# Altium footprint library LUMI_Standard_Auto_Soldering_LIB.PcbLib: 344 footprints (part 16 of 22)
Each footprint in its own frame and in the unit in brackets; x right, y up, seen from the top. Pads: shape width x height; smd on the part's side, far side on the other; paste and mask are expansions set on the pad; w line width, h text height; cw(c..) or ccw(c..) is an arc to the next point about the centre after c.
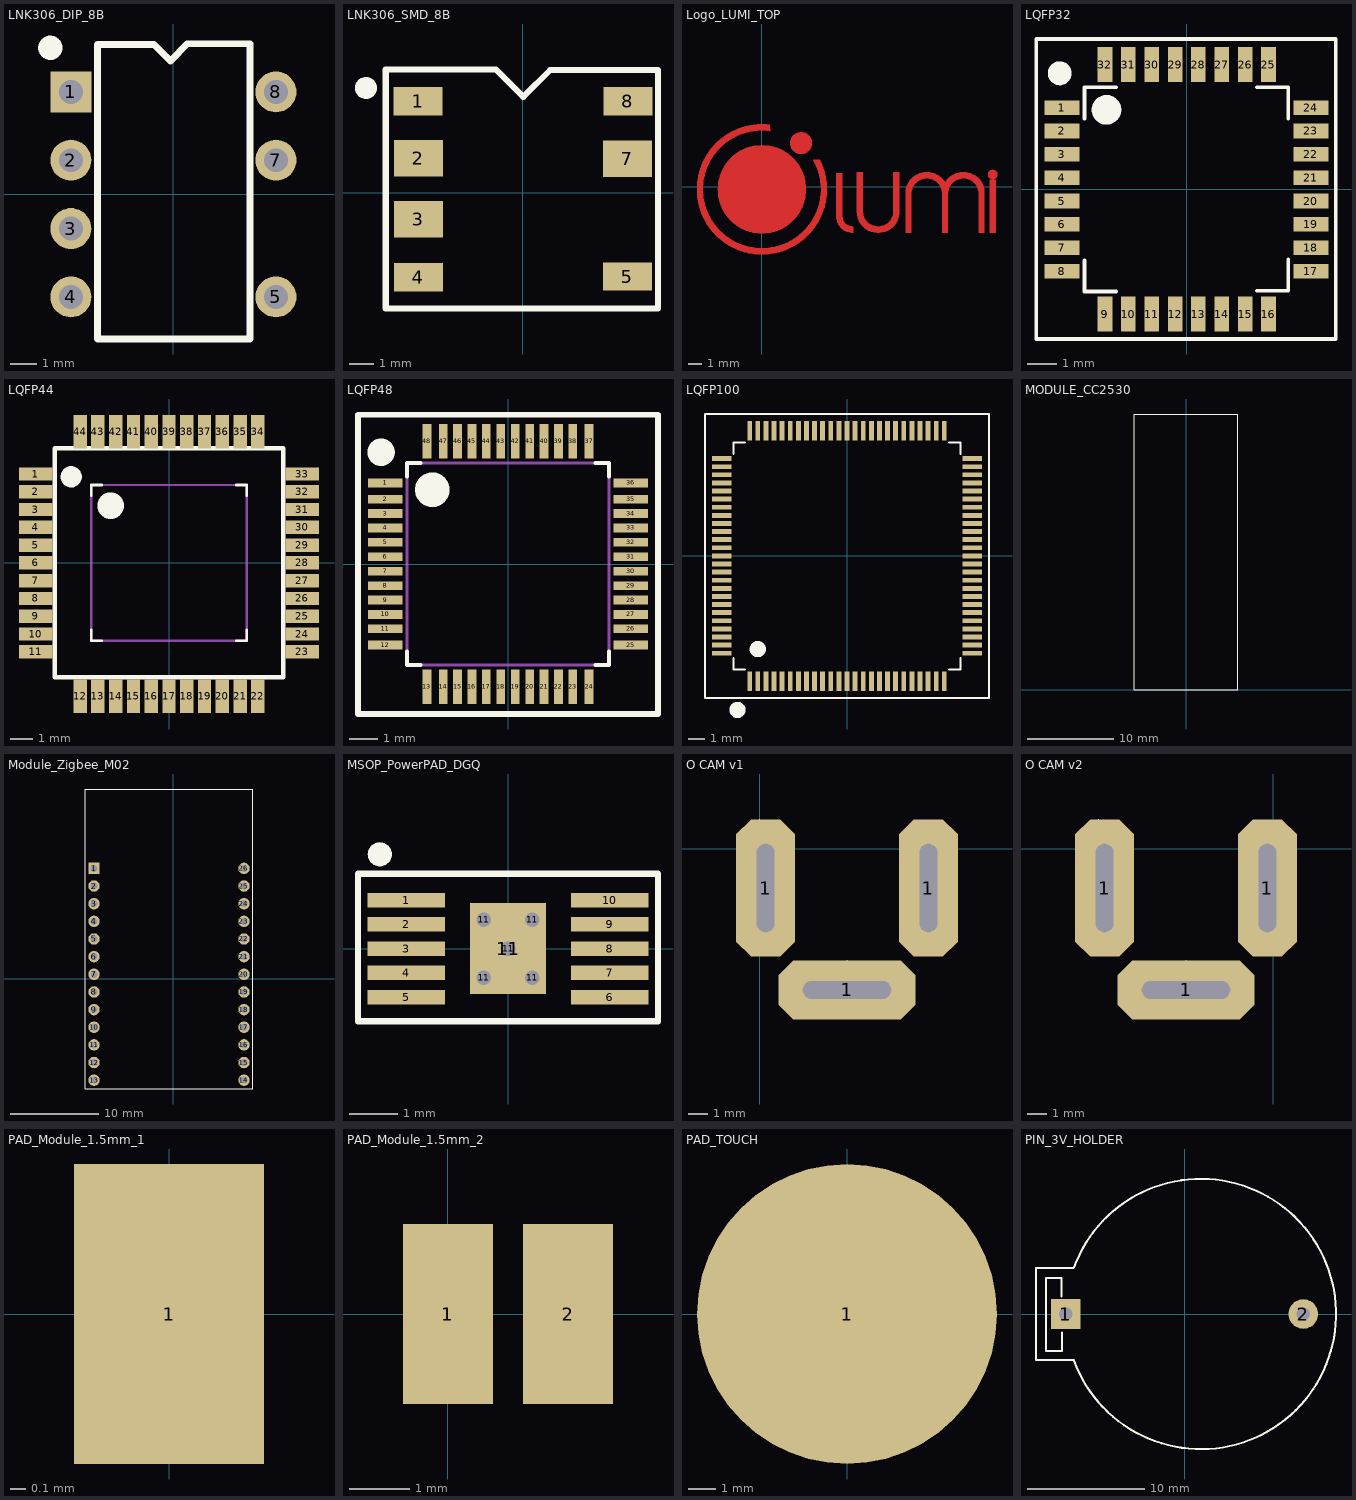
[diagram p15: the footprints below, top view; thin cyan lines are the x and y axes]

## LNK306_DIP_8B [mil]
pads (7):
  rect 60x60 hole 35: 1(-150,150)
  round 60 hole 35: 2(-150,50) 3(-150,-50) 4(-150,-150) 5(150,-150) 7(150,50) 8(150,150)
Top Overlay:
  circle w10: c-180.12,214.57 r12.83
  rectangle: -189.96,204.72 -171.26,224.41
  lines w10: -111.22,-211.61 112.2,-211.61 112.2,220.47 20.67,220.47 -4.43,195.37 -28.54,219.49 -111.22,219.49 -111.22,-211.61
3D body: height 200.39, standoff -137.8, extent -154.92,-209.95 154.93,219.97

## LNK306_SMD_8B [mil]
pads (7):
  rect 80x46 smd: 1(-170.67,149) 4(-170.28,-137.8) 5(170.28,-136.81) 8(171.1,149)
  rect 80x60 smd: 2(-170.28,56.1) 3(-170.28,-43.31) 7(170.28,55.12)
Top Overlay:
  circle w10: c-255.77,170.58 r12.95
  rectangle: -265.75,158.46 -246.06,182.09
  lines w10: -223.43,-189 220.12,-189 220.12,199.8 44.28,199.8 0.49,156.01 -44.29,200.79 -223.43,200.79 -223.43,-189
3D body: height 157.48, standoff 0, extent -192.91,-187.99 192.91,199.8

## Logo_LUMI_TOP [mm]
Top Layer:
  drawing of 2184 lines, arcs and shapes, not listed

## LQFP32 [mm]
pads (32):
  rect 1.2x0.5 smd: 1(-4.275,2.8) 2(-4.275,2) 3(-4.275,1.2) 4(-4.275,0.4) 5(-4.275,-0.4) 6(-4.275,-1.2) 7(-4.275,-2) 8(-4.275,-2.8) 17(4.25,-2.8) 18(4.25,-2) 19(4.25,-1.2) 20(4.25,-0.4) 21(4.25,0.4) 22(4.25,1.2) 23(4.25,2) 24(4.25,2.8)
  rect 0.5x1.2 smd: 9(-2.8,-4.275) 10(-2,-4.275) 11(-1.2,-4.275) 12(-0.4,-4.275) 13(0.4,-4.275) 14(1.2,-4.275) 15(2,-4.275) 16(2.8,-4.275) 25(2.8,4.275) 26(2,4.275) 27(1.2,4.275) 28(0.4,4.275) 29(-0.4,4.275) 30(-1.2,4.275) 31(-2,4.275) 32(-2.8,4.275)
Top Overlay:
  circle w0.5: c-2.75,2.725 r0.257
  circle w0.254: c-4.35,3.975 r0.283
  rectangle: -4.575,3.775 -4.125,4.2
  lines w0.127: -3.5,-2.425 -3.5,-3.5 -2.425,-3.5 ; -3.5,2.425 -3.5,3.5 -2.425,3.5 ; 2.4,-3.475 3.475,-3.475 3.475,-2.4 ; 2.4,3.5 3.475,3.5 3.475,2.425 ; -5.15,-5.125 -5.15,2.15 -5.15,5.15 5.1,5.15 5.1,-5.125 -5.15,-5.125
3D body: height 1.5, standoff 0.02, extent -4.5,-4.5 4.5,4.5

## LQFP44 [mm]
pads (44):
  rect 1.5x0.6 smd paste+0 mask+0: 1(-6,4) 2(-6,3.2) 3(-6,2.4) 4(-6,1.6) 5(-6,0.8) 6(-6,0) 7(-6,-0.8) 8(-6,-1.6) 9(-6,-2.4) 10(-6,-3.2) 11(-6,-4) 23(6,-4) 24(6,-3.2) 25(6,-2.4) 26(6,-1.6) 27(6,-0.8) 28(6,0) 29(6,0.8) 30(6,1.6) 31(6,2.4) 32(6,3.2) 33(6,4)
  rect 0.6x1.5 smd paste+0 mask+0: 12(-4,-6) 13(-3.2,-6) 14(-2.4,-6) 15(-1.6,-6) 16(-0.8,-6) 17(0,-6) 18(0.8,-6) 19(1.6,-6) 20(2.4,-6) 21(3.2,-6) 22(4,-6) 34(4,5.9) 35(3.2,5.9) 36(2.4,5.9) 37(1.6,5.9) 38(0.8,5.9) 39(0,5.9) 40(-0.8,5.9) 41(-1.6,5.9) 42(-2.4,5.9) 43(-3.2,5.9) 44(-4,5.9)
Top Overlay:
  circle w0.5: c-4.4,3.875 r0.226
  circle w0.6: c-2.625,2.575 r0.3
  lines w0.127: -3.5,-3.025 -3.5,-3.5 -3.025,-3.5 ; -3.5,3.025 -3.5,3.5 -3.025,3.5 ; 3.025,-3.5 3.5,-3.5 3.5,-3.025 ; 3.025,3.5 3.5,3.5 3.5,3.025
  lines w0.203: -5.15,-5.15 5.15,-5.15 5.15,5.15 -5.15,5.15 -5.15,-5.15
Mechanical 13:
  circle w0.1: c-2.6,2.6 r0.5
  lines w0.1: -3.5,-3.5 -3.5,3.5 3.5,3.5 3.5,-3.5 -3.5,-3.5
3D body: height 1.5, standoff 0, extent -4.5,-4.5 4.5,4.5

## LQFP48 [mm] "Thin QFP, 48-Leads, Body 7x7mm, Pitch 0.5mm, IPC Medium Density"
height 1.6
pads (48):
  rect 1.2x0.3 smd paste+0 mask+0.07: 1(-4.25,2.81) 2(-4.25,2.25) 3(-4.25,1.75) 4(-4.25,1.25) 5(-4.25,0.75) 6(-4.25,0.25) 7(-4.25,-0.25) 8(-4.25,-0.75) 9(-4.25,-1.25) 10(-4.25,-1.75) 11(-4.25,-2.25) 12(-4.25,-2.81) 25(4.25,-2.81) 26(4.25,-2.25) 27(4.25,-1.75) 28(4.25,-1.25) 29(4.25,-0.75) 30(4.25,-0.25) 31(4.25,0.25) 32(4.25,0.75) 33(4.25,1.25) 34(4.25,1.75) 35(4.25,2.25) 36(4.25,2.81)
  rect 0.3x1.2 smd paste+0 mask+0.07: 13(-2.81,-4.25) 14(-2.25,-4.25) 15(-1.75,-4.25) 16(-1.25,-4.25) 17(-0.75,-4.25) 18(-0.25,-4.25) 19(0.25,-4.25) 20(0.75,-4.25) 21(1.25,-4.25) 22(1.75,-4.25) 23(2.25,-4.25) 24(2.81,-4.25) 37(2.81,4.25) 38(2.25,4.25) 39(1.75,4.25) 40(1.25,4.25) 41(0.75,4.25) 42(0.25,4.25) 43(-0.25,4.25) 44(-0.75,4.25) 45(-1.25,4.25) 46(-1.75,4.25) 47(-2.25,4.25) 48(-2.81,4.25)
Top Overlay:
  circle w0.6: c-2.625,2.575 r0.3
  circle w0.5: c-4.4,3.875 r0.226
  lines w0.127: -3.5,-3.025 -3.5,-3.5 -3.025,-3.5 ; -3.5,3.025 -3.5,3.5 -3.025,3.5 ; 3.025,-3.5 3.5,-3.5 3.5,-3.025 ; 3.025,3.5 3.5,3.5 3.5,3.025
  lines w0.2: -5.2,-5.2 5.2,-5.2 5.2,5.175 -5.2,5.175 -5.2,-5.2
Mechanical 13:
  circle w0.1: c-2.6,2.6 r0.5
  lines w0.1: -3.5,-3.5 3.5,-3.5 3.5,3.5 -3.5,3.5 -3.5,-3.5
Mechanical 15:
  lines w0.1: -5.2,-5.2 5.2,-5.2 5.2,5.2 -5.2,5.2 -5.2,-5.2
3D body: height 1.5, standoff 0, extent -4.5,-4.5 4.5,4.5

## LQFP100 [mm]
pads (100):
  rect 0.3x1.2 smd mask+0.07: 1(-6,-7.725) 2(-5.5,-7.725) 3(-5,-7.725) 4(-4.5,-7.725) 5(-4,-7.725) 6(-3.5,-7.725) 7(-3,-7.725) 8(-2.5,-7.725) 9(-2,-7.725) 10(-1.5,-7.725) 11(-1,-7.725) 12(-0.5,-7.725) 13(0,-7.725) 14(0.5,-7.725) 15(1,-7.725) 16(1.5,-7.725) 17(2,-7.725) 18(2.5,-7.725) 19(3,-7.725) 20(3.5,-7.725) 21(4,-7.725) 22(4.5,-7.725) 23(5,-7.725) 24(5.5,-7.725) 25(6,-7.725) 51(6,7.725) 52(5.5,7.725) 53(5,7.725) 54(4.5,7.725) 55(4,7.725) 56(3.5,7.725) 57(3,7.725) 58(2.5,7.725) 59(2,7.725) 60(1.5,7.725) 61(1,7.725) 62(0.5,7.725) 63(0,7.725) 64(-0.5,7.725) 65(-1,7.725) 66(-1.5,7.725) 67(-2,7.725) 68(-2.5,7.725) 69(-3,7.725) 70(-3.5,7.725) 71(-4,7.725) 72(-4.5,7.725) 73(-5,7.725) 74(-5.5,7.725) 75(-6,7.725)
  rect 1.2x0.3 smd mask+0.07: 26(7.725,-6) 27(7.725,-5.5) 28(7.725,-5) 29(7.725,-4.5) 30(7.725,-4) 31(7.725,-3.5) 32(7.725,-3) 33(7.725,-2.5) 34(7.725,-2) 35(7.725,-1.5) 36(7.725,-1) 37(7.725,-0.5) 38(7.725,0) 39(7.725,0.5) 40(7.725,1) 41(7.725,1.5) 42(7.725,2) 43(7.725,2.5) 44(7.725,3) 45(7.725,3.5) 46(7.725,4) 47(7.725,4.5) 48(7.725,5) 49(7.725,5.5) 50(7.725,6) 76(-7.725,6) 77(-7.725,5.5) 78(-7.725,5) 79(-7.725,4.5) 80(-7.725,4) 81(-7.725,3.5) 82(-7.725,3) 83(-7.725,2.5) 84(-7.725,2) 85(-7.725,1.5) 86(-7.725,1) 87(-7.725,0.5) 88(-7.725,0) 89(-7.725,-0.5) 90(-7.725,-1) 91(-7.725,-1.5) 92(-7.725,-2) 93(-7.725,-2.5) 94(-7.725,-3) 95(-7.725,-3.5) 96(-7.725,-4) 97(-7.725,-4.5) 98(-7.725,-5) 99(-7.725,-5.5) 100(-7.725,-6)
Top Overlay:
  circle w0.5: c-6.75,-9.5 r0.25
  circle w0.5: c-5.5,-5.75 r0.25
  lines w0.127: -7,-6.3 -7,-7 -6.3,-7 ; -7,6.3 -7,7 -6.3,7 ; 6.3,-7 7,-7 7,-6.3 ; 6.3,7 7,7 7,6.3 ; -8.75,-8.75 8.75,-8.75 8.75,8.75 -8.75,8.75 -8.75,-8.75
3D body: height 1.6, standoff 0, extent -8,-8 8,8

## MODULE_CC2530 [mm]
Top Overlay:
  lines w0.127: -6,0 -6,32 6,32 6,0 -6,0
Bottom Overlay:
  rectangle: -2.1,-2.8 -1.7,0
  rectangle: -3.375,-2.8 -2.975,0
  rectangle: -4.65,-2.8 -4.25,0
  rectangle: -0.85,-2.8 -0.45,0
  rectangle: 0.425,-2.8 0.825,0
  rectangle: 1.7,-2.8 2.1,0
  rectangle: 2.975,-2.8 3.375,0
  rectangle: 4.25,-2.8 4.65,0
3D body: height 1.3, standoff -3.39, extent -6,-2.81 6,32

## Module_Zigbee_M02 [mm]
pads (26):
  rect 1.3x1.3 hole 0.8 mask+0.07: 1(-9,12.5)
  round 1.3 hole 0.8 mask+0.07: 2(-9,10.5) 3(-9,8.5) 4(-9,6.5) 5(-9,4.5) 6(-9,2.5) 7(-9,0.5) 8(-9,-1.5) 9(-9,-3.5) 10(-9,-5.5) 11(-9,-7.5) 12(-9,-9.5) 13(-9,-11.5) 14(8,-11.5) 15(8,-9.5) 16(8,-7.5) 17(8,-5.5) 18(8,-3.5) 19(8,-1.5) 20(8,0.5) 21(8,2.5) 22(8,4.5) 23(8,6.5) 24(8,8.5) 25(8,10.5) 26(8,12.5)
Top Overlay:
  lines w0.127: -10,-12.5 -10,21.5 9,21.5 9,-12.5 -10,-12.5
Bottom Overlay:
  rectangle: 9,9.5 11,13.5
  rectangle: 9,5.5 11,9.5
  rectangle: 9,1.5 11,5.5
  rectangle: 9,-2.5 11,1.5
  rectangle: 9,-6.5 11,-2.5
  rectangle: 9,-10.5 11,-6.5
  rectangle: 9,-12.5 11,-8.5
  region: -10,13.5 -12,13.5 -12,9.5 -10,9.5
  region: -10,11.5 -12,11.5 -12,7.5 -10,7.5
  region: -10,7.5 -12,7.5 -12,3.5 -10,3.5
  region: -10,3.5 -12,3.5 -12,-0.5 -10,-0.5
  region: -10,-0.5 -12,-0.5 -12,-4.5 -10,-4.5
  region: -10,-4.5 -12,-4.5 -12,-8.5 -10,-8.5
  region: -10,-8.5 -12,-8.5 -12,-12.5 -10,-12.5
  lines w0.127: -9,-12.5 -12,-12.5 -12,-8.5 ; -9,9.5 -12,9.5 -12,13.5 -9,13.5 ; -9,11.5 -12,11.5 -12,7.5 ; 8,-12.5 11,-12.5 11,-8.5 8,-8.5 ; 8,-10.5 11,-10.5 11,-6.5 ; 8,13.5 11,13.5 11,9.5 ; -12,-8.5 -9,-8.5 -12,-8.5 ; -12,-8.5 -12,-4.5 ; -12,-4.5 -9,-4.5 -12,-4.5 ; -12,-4.5 -12,-0.5 ; -12,-0.5 -9,-0.5 -12,-0.5 ; -12,-0.5 -12,3.5 ; -12,3.5 -9,3.5 -12,3.5 ; -12,3.5 -12,7.5 ; -12,7.5 -9,7.5 -12,7.5 ; -10,-8.5 -8,-8.5 ; -10,-8.5 -10,-4.5 ; -10,-8.5 -8,-8.5 ; -10,-8.5 -10,-12.5 -8,-12.5 -8,-8.5 ; -10,-4.5 -8,-4.5 ; -10,-4.5 -10,-0.5 ; -10,-4.5 -8,-4.5 ; -10,-0.5 -8,-0.5 ; -10,-0.5 -10,3.5 ; -10,-0.5 -8,-0.5 ; -10,3.5 -8,3.5 ; -10,3.5 -10,7.5 ; -10,3.5 -8,3.5 ; -10,7.5 -8,7.5 ; -10,7.5 -10,11.5 -8,11.5 -8,7.5 ; -10,7.5 -8,7.5 ; -8,-8.5 -8,-4.5 ; -8,-4.5 -8,-0.5 ; -8,-0.5 -8,3.5 ; -8,3.5 -8,7.5 ; 7,-6.5 7,-2.5 ; 7,-6.5 9,-6.5 ; 7,-6.5 7,-10.5 9,-10.5 9,-6.5 ; 7,-6.5 9,-6.5 ; 7,-2.5 7,1.5 ; 7,-2.5 9,-2.5 ; 7,-2.5 9,-2.5 ; 7,1.5 7,5.5 ; 7,1.5 9,1.5 ; 7,1.5 9,1.5 ; 7,5.5 7,9.5 ; 7,5.5 9,5.5 ; 7,5.5 9,5.5 ; 7,9.5 7,13.5 9,13.5 9,9.5 ; 7,9.5 9,9.5 ; 7,9.5 9,9.5 ; 9,-6.5 9,-2.5 ; 9,-2.5 9,1.5 ; 9,1.5 9,5.5 ; 9,5.5 9,9.5 ; 11,-6.5 8,-6.5 11,-6.5 ; 11,-6.5 11,-2.5 ; 11,-2.5 8,-2.5 11,-2.5 ; 11,-2.5 11,1.5 ; 11,1.5 8,1.5 11,1.5 ; 11,1.5 11,5.5 ; 11,5.5 8,5.5 11,5.5 ; 11,5.5 11,9.5 ; 11,9.5 8,9.5 11,9.5 ; -10,9.5 -8,9.5 -8,13.5 -10,13.5 -10,9.5 ; 7,-12.5 7,-8.5 9,-8.5 9,-12.5 7,-12.5
  lines w0.5: -16,-11.5 -12,-11.5 ; -16,-9.5 -12,-9.5 ; -16,-7.5 -12,-7.5 ; -16,-5.5 -12,-5.5 ; -16,-3.5 -12,-3.5 ; -16,-1.5 -12,-1.5 ; -16,0.5 -12,0.5 ; -16,2.5 -12,2.5 ; -16,4.5 -12,4.5 ; -16,6.5 -12,6.5 ; -16,8.5 -12,8.5 ; -16,12.5 -12,12.5 ; 11,-11.5 15,-11.5 ; 11,-7.5 15,-7.5 ; 11,-5.5 15,-5.5 ; 11,-3.5 15,-3.5 ; 11,-1.5 15,-1.5 ; 11,0.5 15,0.5 ; 11,2.5 15,2.5 ; 11,4.5 15,4.5 ; 11,6.5 15,6.5 ; 11,8.5 15,8.5 ; 11,10.5 15,10.5 ; 11,12.5 15,12.5 ; -16,10.5 -12,10.5 -16,10.5 ; 11,-9.5 15,-9.5 11,-9.5
3D body: height 2, standoff 0, extent 9,9.5 11,13.5
3D body: height 1.25, standoff 0.75, extent 8.249,10.25 15.249,10.748
3D body: height 1, standoff -2, extent 7.751,10.25 8.25,10.748
3D body: height 1, standoff -2, extent 7.751,12.25 8.25,12.748
3D body: height 1.25, standoff 0.75, extent 8.249,12.25 15.249,12.748
3D body: height 2, standoff 0, extent 9,5.5 11,9.5
3D body: height 1.25, standoff 0.75, extent 8.249,6.25 15.249,6.748
3D body: height 1, standoff -2, extent 7.751,6.25 8.25,6.748
3D body: height 1, standoff -2, extent 7.751,8.25 8.25,8.748
3D body: height 1.25, standoff 0.75, extent 8.249,8.25 15.249,8.748
3D body: height 2, standoff 0, extent 9,1.5 11,5.5
3D body: height 1.25, standoff 0.75, extent 8.249,2.25 15.249,2.748
3D body: height 1, standoff -2, extent 7.751,2.25 8.25,2.748
3D body: height 1, standoff -2, extent 7.751,4.25 8.25,4.748
3D body: height 1.25, standoff 0.75, extent 8.249,4.25 15.249,4.748
3D body: height 2, standoff 0, extent 9,-2.5 11,1.5
3D body: height 1.25, standoff 0.75, extent 8.249,-1.75 15.249,-1.252
3D body: height 1, standoff -2, extent 7.751,-1.75 8.25,-1.252
3D body: height 1, standoff -2, extent 7.751,0.25 8.25,0.748
3D body: height 1.25, standoff 0.75, extent 8.249,0.25 15.249,0.748
3D body: height 2, standoff 0, extent 9,-6.5 11,-2.5
3D body: height 1.25, standoff 0.75, extent 8.249,-5.75 15.249,-5.252
3D body: height 1, standoff -2, extent 7.751,-5.75 8.25,-5.252
3D body: height 1, standoff -2, extent 7.751,-3.75 8.25,-3.252
3D body: height 1.25, standoff 0.75, extent 8.249,-3.75 15.249,-3.252
3D body: height 2, standoff 0, extent 9,-10.5 11,-6.5
3D body: height 1.25, standoff 0.75, extent 8.249,-9.75 15.249,-9.252
3D body: height 1, standoff -2, extent 7.751,-9.75 8.25,-9.252
3D body: height 1, standoff -2, extent 7.751,-7.75 8.25,-7.252
3D body: height 1.25, standoff 0.75, extent 8.249,-7.75 15.249,-7.252
3D body: height 2, standoff 0, extent 9,-12.5 11,-8.5
3D body: height 1.25, standoff 0.75, extent 8.249,-11.75 15.249,-11.252
3D body: height 1, standoff -2, extent 7.751,-11.75 8.25,-11.252
3D body: height 1, standoff -2, extent 7.751,-9.75 8.25,-9.252
3D body: height 1.25, standoff 0.75, extent 8.249,-9.75 15.249,-9.252
3D body: height 2, standoff 0, extent -12,9.5 -10,13.5
3D body: height 1.25, standoff 0.75, extent -16.249,12.252 -9.249,12.75
3D body: height 1, standoff -2, extent -9.25,12.252 -8.751,12.75
3D body: height 1, standoff -2, extent -9.25,10.252 -8.751,10.75
3D body: height 1.25, standoff 0.75, extent -16.249,10.252 -9.249,10.75
3D body: height 2, standoff 0, extent -12,7.5 -10,11.5
3D body: height 1.25, standoff 0.75, extent -16.249,10.252 -9.249,10.75
3D body: height 1, standoff -2, extent -9.25,10.252 -8.751,10.75
3D body: height 1, standoff -2, extent -9.25,8.252 -8.751,8.75
3D body: height 1.25, standoff 0.75, extent -16.249,8.252 -9.249,8.75
3D body: height 2, standoff 0, extent -12,3.5 -10,7.5
3D body: height 1.25, standoff 0.75, extent -16.249,6.252 -9.249,6.75
3D body: height 1, standoff -2, extent -9.25,6.252 -8.751,6.75
3D body: height 1, standoff -2, extent -9.25,4.252 -8.751,4.75
3D body: height 1.25, standoff 0.75, extent -16.249,4.252 -9.249,4.75
3D body: height 2, standoff 0, extent -12,-0.5 -10,3.5
3D body: height 1.25, standoff 0.75, extent -16.249,2.252 -9.249,2.75
3D body: height 1, standoff -2, extent -9.25,2.252 -8.751,2.75
3D body: height 1, standoff -2, extent -9.25,0.252 -8.751,0.75
3D body: height 1.25, standoff 0.75, extent -16.249,0.252 -9.249,0.75
3D body: height 2, standoff 0, extent -12,-4.5 -10,-0.5
3D body: height 1.25, standoff 0.75, extent -16.249,-1.748 -9.249,-1.25
3D body: height 1, standoff -2, extent -9.25,-1.748 -8.751,-1.25
3D body: height 1, standoff -2, extent -9.25,-3.748 -8.751,-3.25
3D body: height 1.25, standoff 0.75, extent -16.249,-3.748 -9.249,-3.25
3D body: height 2, standoff 0, extent -12,-8.5 -10,-4.5
3D body: height 1.25, standoff 0.75, extent -16.249,-5.748 -9.249,-5.25
3D body: height 1, standoff -2, extent -9.25,-5.748 -8.751,-5.25
3D body: height 1, standoff -2, extent -9.25,-7.748 -8.751,-7.25
3D body: height 1.25, standoff 0.75, extent -16.249,-7.748 -9.249,-7.25
3D body: height 2, standoff 0, extent -12,-12.5 -10,-8.5
3D body: height 1.25, standoff 0.75, extent -16.249,-9.748 -9.249,-9.25
3D body: height 1, standoff -2, extent -9.25,-9.748 -8.751,-9.25
3D body: height 1, standoff -2, extent -9.25,-11.748 -8.751,-11.25
3D body: height 1.25, standoff 0.75, extent -16.249,-11.748 -9.249,-11.25
3D body: height 0.8, standoff -0.8, extent -10,-12.5 9,21.5

## MSOP_PowerPAD_DGQ [mm]
pads (17):
  rect 1.6x0.3 smd mask+0: 1(-2.1,1) 2(-2.1,0.5) 3(-2.1,0) 4(-2.1,-0.5) 5(-2.1,-1) 6(2.1,-1) 7(2.1,-0.5) 8(2.1,0) 9(2.1,0.5) 10(2.1,1)
  round 0.3 hole 0.3: 11(-0.5,-0.6) 11(-0.5,0.6) 11(0,0) 11(0.5,-0.6) 11(0.5,0.6)
  rect 1.57x1.88 smd mask+0.05: 11(0,0)
  round 0.5 on Top Overlay: ""(-2.65,1.95)
Top Overlay:
  lines w0.127: -3.1,-1.499 3.1,-1.499 3.1,1.549 -3.1,1.549 -3.1,-1.499
3D body: height 0.94, standoff -0.02, extent -2.451,-1.499 2.451,1.498

## O CAM v1 [mm]
pads (5):
  round 0.254 hole 0.127: 0(4.45,-7.2) 0(8.6,-2)
  oct 3x7 hole 0.9 slot 4.5 at 90 deg: 1(0.3,-2) 1(8.6,-2)
  oct 7x3 hole 0.9 slot 4.5 at 0 deg: 1(4.45,-7.2)
Top Overlay:
  lines w0.025: 0,0 0,1.5 ; 0.3,-4.5 0.3,0.2 ; 4.45,-7.675 4.45,-5.675 ; 4.45,-7.2 6.45,-7.2
  lines w0.051: 0,-4 0,0 ; 0,-4 0.6,-4 ; 0,-4 0,0 ; 0,-4 0.6,-4 ; 0,0 0.6,0 ; 0,0 0.6,0 ; 0.6,-4 0.6,0 ; 0.6,-4 0.6,0 ; 2.45,-7.5 6.45,-7.5 ; 2.45,-7.5 2.45,-6.9 ; 2.45,-7.5 6.45,-7.5 ; 2.45,-7.5 2.45,-6.9 ; 2.45,-7.5 6.45,-7.5 ; 2.45,-6.9 6.45,-6.9 ; 2.45,-6.9 6.45,-6.9 ; 6.45,-7.5 6.45,-6.9 ; 6.45,-7.5 6.45,-6.9 ; 8.3,-4 8.3,0 ; 8.3,-4 8.9,-4 ; 8.3,-4 8.3,0 ; 8.3,-4 8.9,-4 ; 8.3,0 8.9,0 ; 8.3,0 8.9,0 ; 8.9,-4 8.9,0 ; 8.9,-4 8.9,0
3D body: height 15.59, standoff -2.5, extent -0.047,-7.5 8.897,0.972

## O CAM v2 [mm]
pads (5):
  round 0.254 hole 0.127: 0(-4.45,-7.2) 0(-0.3,-2)
  oct 3x7 hole 0.9 slot 4.5 at 90 deg: 1(-8.6,-2) 1(-0.3,-2)
  oct 7x3 hole 0.9 slot 4.5 at 0 deg: 1(-4.45,-7.2)
Top Overlay:
  lines w0.025: -8.9,0 -8.9,1.5 ; -8.6,-4.5 -8.6,0.2 ; -4.45,-7.675 -4.45,-5.675 ; -4.45,-7.2 -2.45,-7.2
  lines w0.051: -8.9,-4 -8.3,-4 ; -8.9,-4 -8.9,0 ; -8.9,-4 -8.3,-4 ; -8.9,-4 -8.9,0 ; -8.9,0 -8.3,0 ; -8.9,0 -8.3,0 ; -8.3,-4 -8.3,0 ; -8.3,-4 -8.3,0 ; -6.45,-7.5 -2.45,-7.5 ; -6.45,-7.5 -6.45,-6.9 ; -6.45,-7.5 -2.45,-7.5 ; -6.45,-7.5 -6.45,-6.9 ; -6.45,-7.5 -2.45,-7.5 ; -6.45,-6.9 -2.45,-6.9 ; -6.45,-6.9 -2.45,-6.9 ; -2.45,-7.5 -2.45,-6.9 ; -2.45,-7.5 -2.45,-6.9 ; -0.6,-4 0,-4 ; -0.6,-4 -0.6,0 ; -0.6,-4 0,-4 ; -0.6,-4 -0.6,0 ; -0.6,0 0,0 ; -0.6,0 0,0 ; 0,-4 0,0 ; 0,-4 0,0
3D body: height 15.59, standoff -2.5, extent -8.947,-7.5 -0.003,0.972

## PAD_Module_1.5mm_1 [mm]
pads (1):
  rect 1.27x2 smd: 1(0,0)

## PAD_Module_1.5mm_2 [mm]
pads (2):
  rect 1.5x3 smd: 1(0,0) 2(2,0)

## PAD_TOUCH [mm]
pads (1):
  round 11 smd mask+0.07: 1(0,0)

## PIN_3V_HOLDER [mil]
pads (2):
  rect 100x100 hole 45: 1(-400,0)
  round 100 hole 45: 2(400,0)
Top Overlay:
  lines w7: -414,59 -414,121 -466,121 -466,-124 -413,-124 -413,-63 ; -373.67,155 -500,155 -500,-155 -372.07,-155 ; -372.4,156.07 cw(c55,0) -372.07,-156.96
3D body: height 278.16, standoff -137.2, extent -528.08,-446.83 601.84,448.84